# Altium footprint library PcbLib1.PcbLib: 8 footprints
Each footprint in its own frame and in the unit in brackets; x right, y up, seen from the top. Pads: shape width x height; smd on the part's side, far side on the other; paste and mask are expansions set on the pad; w line width, h text height; cw(c..) or ccw(c..) is an arc to the next point about the centre after c.
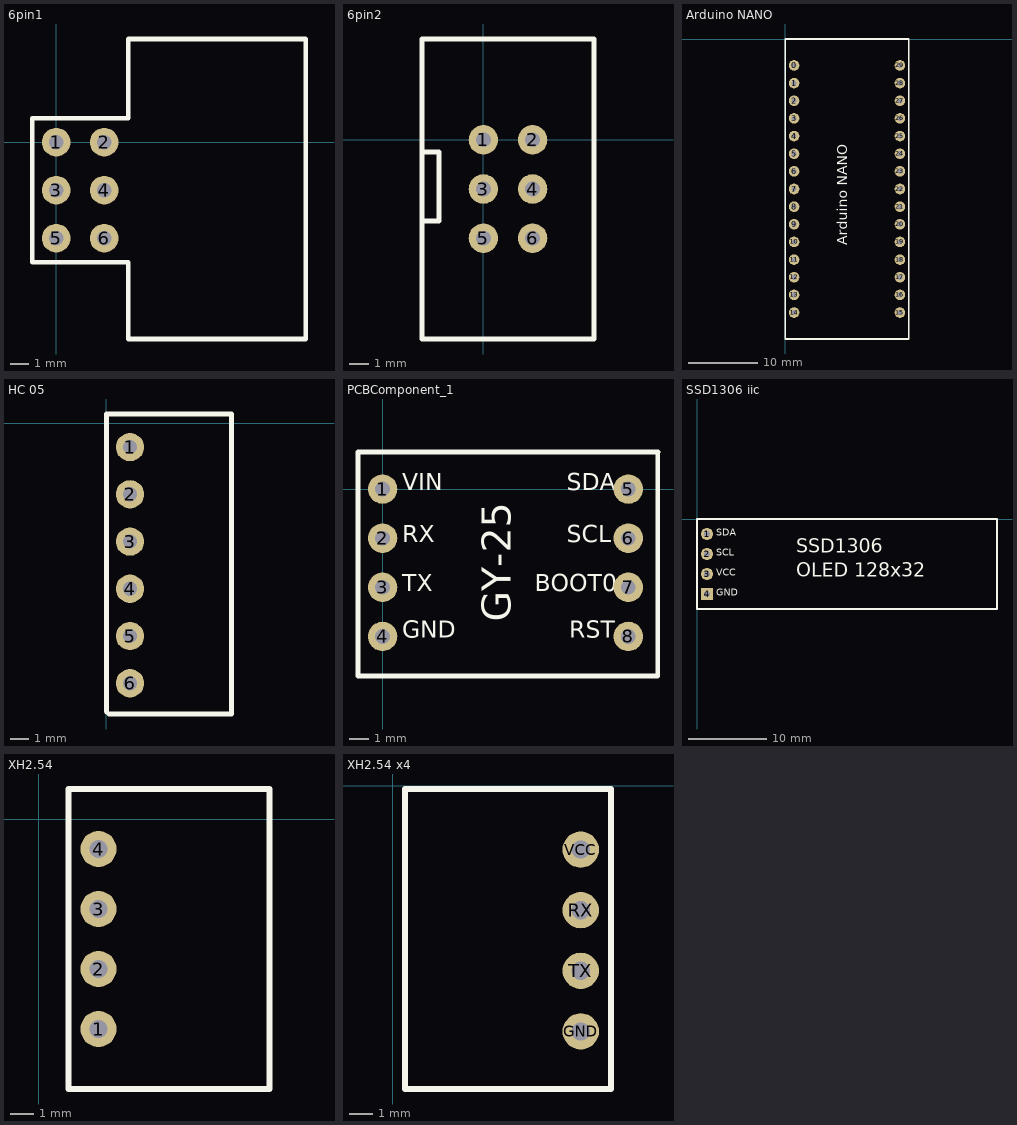
[diagram p0: the footprints below, top view; thin cyan lines are the x and y axes]

## 6pin1 [mil]
pads (6):
  round 60 hole 30: 1(0,0) 2(100,0) 3(0,-100) 4(100,-100) 5(0,-200) 6(100,-200)
Top Overlay:
  lines w10: -50,-250 -50,50 150,50 150,215 520,215 520,-410 150,-410 150,-250 -50,-250
3D body "User Library-IDC Socket Male 6pin Angled THT Goldplated 2_54mm.STEP": height 337.32, standoff -109.53, extent -15,-409.41 518.86,215

## 6pin2 [mil]
pads (6):
  round 60 hole 30: 1(0,0) 2(100,0) 3(0,-100) 4(100,-100) 5(0,-200) 6(100,-200)
Top Overlay:
  lines w10: -125,-165 -90,-165 -90,-25 -125,-25 ; -125,-405 225,-405 225,205 -125,205 -125,-405
3D body "User Library-DS1013-6S (IDC-6MS CONNFLY).STEP": height 358.27, standoff -137.8, extent -125,-403.55 221.46,203.54
3D body: height 232.28, standoff 0, extent -50,240 -50,240

## Arduino NANO [mil]
pads (30):
  round 60 hole 30: 0(50,-150) 1(50,-250) 2(50,-350) 3(50,-450) 4(50,-550) 5(50,-650) 6(50,-750) 7(50,-850) 8(50,-950) 9(50,-1050) 10(50,-1150) 11(50,-1250) 12(50,-1350) 13(50,-1450) 14(50,-1550) 15(650,-1550) 16(650,-1450) 17(650,-1350) 18(650,-1250) 19(650,-1150) 20(650,-1050) 21(650,-950) 22(650,-850) 23(650,-750) 24(650,-650) 25(650,-550) 26(650,-450) 27(650,-350) 28(650,-250) 29(650,-150)
Top Overlay:
  lines w10: 0,-1700 0,0 700,0 700,-1700 0,-1700
  text "Arduino NANO" at 370,-1170 h100
3D body "User Library-arduino_nano.STEP": height 477.64, standoff -254.65, extent -8.66,-1771.65 700,0
3D body: height 10, standoff 0, extent 490,-1040 490,-1040
3D body: height 10, standoff 0, extent 370,-1050 370,-1050

## HC 05 [mil]
pads (6):
  round 60 hole 30: 1(50,-50) 2(50,-150) 3(50,-250) 4(50,-350) 5(50,-450) 6(50,-550)
Top Overlay:
  lines w10: 10,-615 35,-615 ; 0,-610 0,20 265,20 265,-615 5,-615 0,-610
3D body "User Library-hc05.STEP": height 1496.06, standoff -181.1, extent 32.72,-615 265,18.86

## PCBComponent_1 [mil]
pads (8):
  round 60 hole 30: 1(0,0) 2(0,-100) 3(0,-200) 4(0,-300) 5(500,0) 6(500,-100) 7(500,-200) 8(500,-300)
Top Overlay:
  lines w10: 560,75 560,-380 -50,-380 -50,75 560.5,75
  text "GND" at 40,-315 h60
  text "TX" at 40,-220 h60
  text "RX" at 40,-120 h60
  text "VIN" at 40,-15 h60
  text "GY-25" at 280,-270 h100
  text "SDA" at 375,-15 h60
  text "SCL" at 375,-120 h60
  text "BOOT0" at 310,-220 h60
  text "RST" at 380,-315 h60

## SSD1306 iic [mil]
pads (4):
  round 60 hole 30: 1(50,-75) 2(50,-175) 3(50,-275)
  rect 60x60 hole 30: 4(50,-375)
Top Overlay:
  lines w10: 0,-450 1500,-450 1500,0 0,0 0,-450
  text "SSD1306 / OLED 128x32" at 495,-310 h118.11
  text "SDA" at 95,-95 h60
  text "SCL" at 95,-195 h60
  text "VCC" at 95,-295 h60
  text "GND" at 95,-395 h60
3D body: height 10, standoff 0, extent 235,-310 235,-310
3D body: height 54.33, standoff -654.33, extent 715,-235 715,-235
3D body "User Library-ER-OLED0_084.STEP": height 92.91, standoff 19.68, extent 186.26,-361.1 1395,1.1

## XH2.54 [mil]
pads (4):
  round 60 hole 30: 1(100,-350) 2(100,-250) 3(100,-150) 4(100,-50)
Top Overlay:
  lines w10: 50,-450 50,50 385,50 385,-450 50,-450
3D body "User Library-XH2_54-4P-AW.STEP": height 232.28, standoff -118.11, extent 85,-446.06 384.21,46.06

## XH2.54 x4 [mil]
pads (4):
  round 60 hole 30: GND(310,-405) RX(310,-205) TX(310,-305) VCC(310,-105)
Top Overlay:
  lines w10: 20,-500 20,-5 360,-5 360,-500 20,-500
3D body "User Library-XH2_54-4P-AW.STEP": height 232.28, standoff -118.11, extent 20.39,-500 319.61,-7.87
3D body "User Library-XH2_54-4P-AW.STEP": height 275.59, standoff -23.62, extent -50246.06,-50236.22 -49753.94,-49885.83